# Altium footprint library BBC_Connectors.PcbLib: 141 footprints (part 5 of 9)
Each footprint in its own frame and in the unit in brackets; x right, y up, seen from the top. Pads: shape width x height; smd on the part's side, far side on the other; paste and mask are expansions set on the pad; w line width, h text height; cw(c..) or ccw(c..) is an arc to the next point about the centre after c.
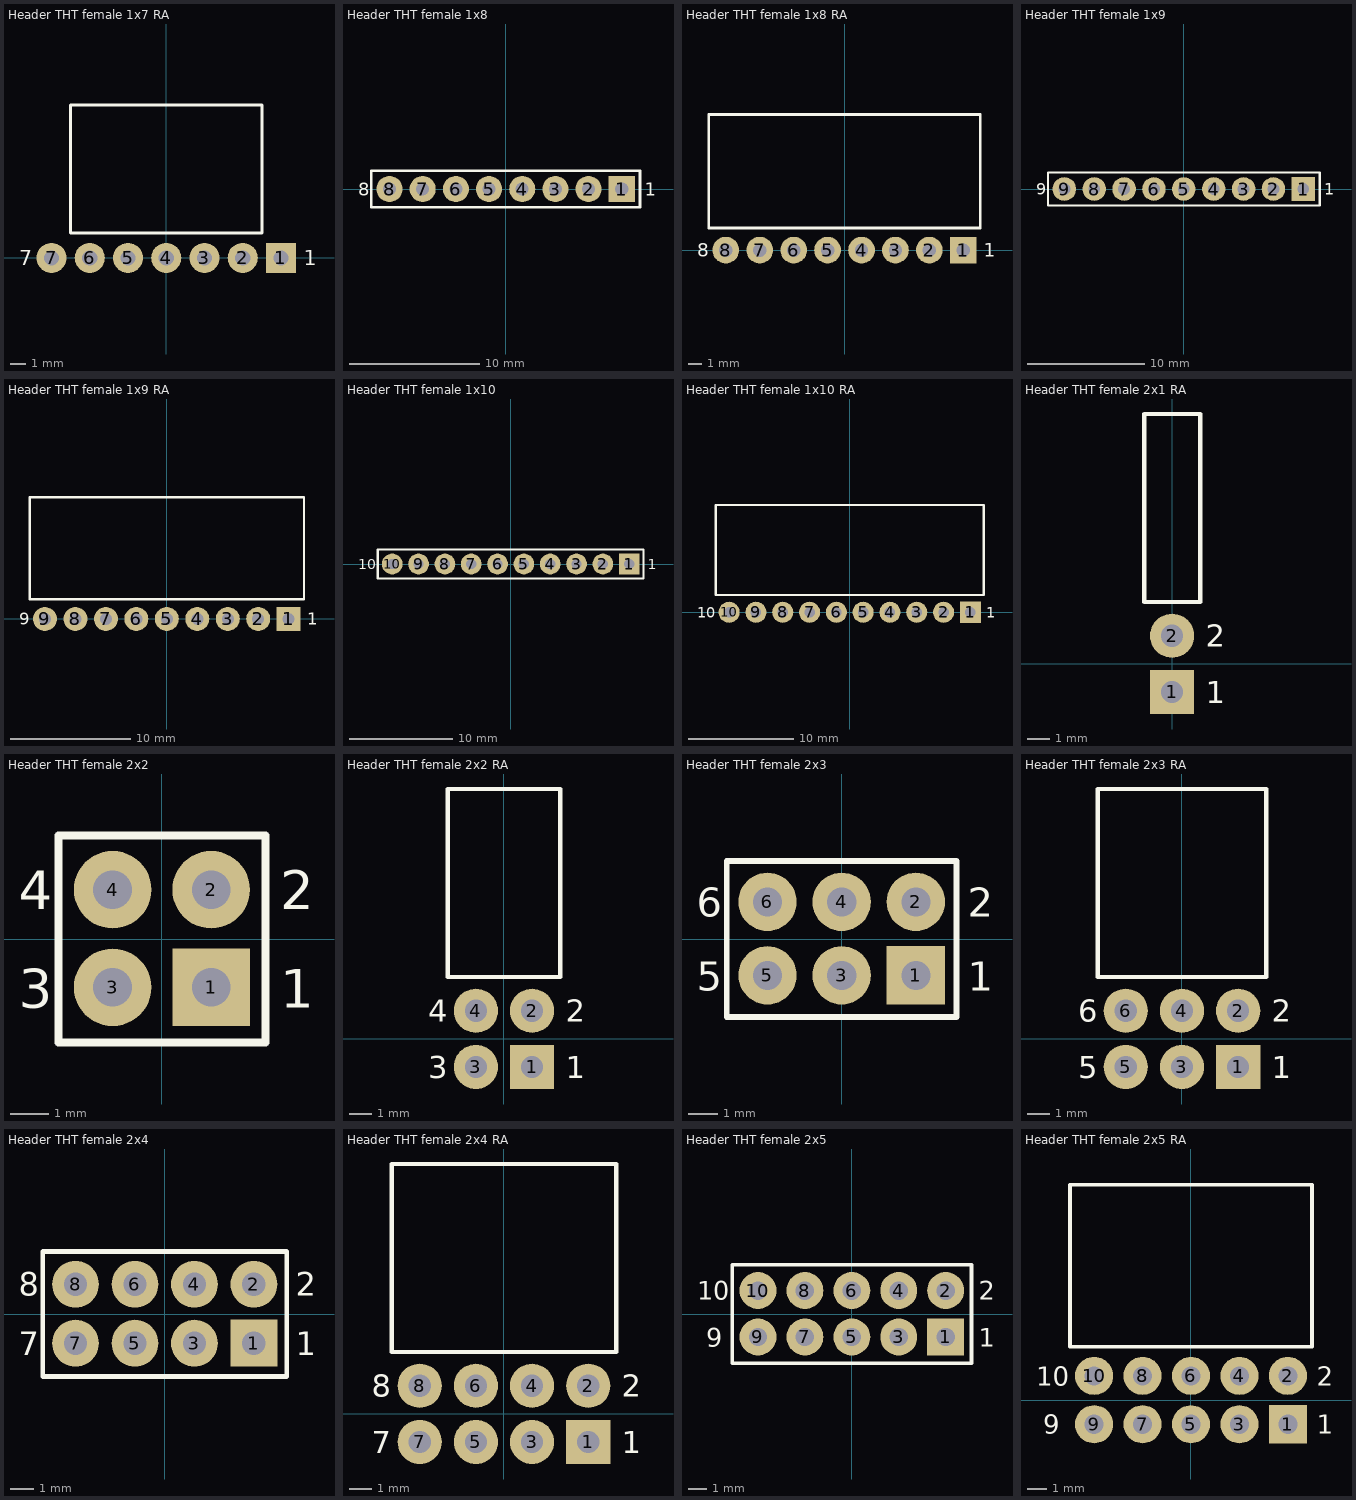
[diagram p4: the footprints below, top view; thin cyan lines are the x and y axes]

## Header THT female 1x7 RA [mm] "right angled header for tht mounting / pitch = 2.54mm"
height 3
pads (7):
  rect 2x2 hole 1: 1(7.62,0)
  round 2 hole 1: 2(5.08,0) 3(2.54,0) 4(0,0) 5(-2.54,0) 6(-5.08,0) 7(-7.62,0)
Top Overlay:
  lines w0.2: -6.35,1.651 6.35,1.651 6.35,10.151 -6.35,10.151 -6.35,1.651
  text "1" at 9.144,-0.5 h1
  text "7" at -9.779,-0.5 h1
3D body "Header THT female 1x7 RA.step": height 2.54, standoff -3.06, extent -8.89,-0.199 8.89,10.151
3D body: height 2.51, standoff -3, extent 2.54,3.81 2.54,3.81

## Header THT female 1x8 [mm] "header for tht mounting / pitch = 2.54mm"
height 11
pads (8):
  rect 2x2 hole 1: 1(8.89,0)
  round 2 hole 1: 2(6.35,0) 3(3.81,0) 4(1.27,0) 5(-1.27,0) 6(-3.81,0) 7(-6.35,0) 8(-8.89,0)
Top Overlay:
  lines w0.2: -10.287,-1.397 -10.287,1.397 10.287,1.397 10.287,-1.397 -10.287,-1.397
  text "8" at -11.303,-0.5 h1
  text "1" at 10.668,-0.5 h1
3D body: height 2.51, standoff -3, extent 2.54,3.81 2.54,3.81
3D body "Header THT female 1x8.step": height 8.5, standoff -3.2, extent -10.16,-1.27 10.16,1.27

## Header THT female 1x8 RA [mm] "right angled header for tht mounting / pitch = 2.54mm"
height 3
pads (8):
  rect 2x2 hole 1: 1(8.89,0)
  round 2 hole 1: 2(6.35,0) 3(3.81,0) 4(1.27,0) 5(-1.27,0) 6(-3.81,0) 7(-6.35,0) 8(-8.89,0)
Top Overlay:
  lines w0.2: -10.16,1.651 -10.16,10.151 10.16,10.151 10.16,1.651 -10.16,1.651
  text "8" at -11.049,-0.5 h1
  text "1" at 10.414,-0.5 h1
3D body "Header THT female 1x8 RA.step": height 2.54, standoff -3.06, extent -10.16,-0.199 10.16,10.151
3D body: height 2.51, standoff -3, extent 2.54,3.81 2.54,3.81

## Header THT female 1x9 [mm] "header for tht mounting / pitch = 2.54mm"
height 11
pads (9):
  rect 2x2 hole 1: 1(10.16,0)
  round 2 hole 1: 2(7.62,0) 3(5.08,0) 4(2.54,0) 5(0,0) 6(-2.54,0) 7(-5.08,0) 8(-7.62,0) 9(-10.16,0)
Top Overlay:
  lines w0.2: -11.557,-1.397 -11.557,1.397 11.557,1.397 11.557,-1.397 -11.557,-1.397
  text "9" at -12.573,-0.5 h1
  text "1" at 11.938,-0.5 h1
3D body: height 2.51, standoff -3, extent 2.54,3.81 2.54,3.81
3D body "Header THT female 1x9.step": height 8.5, standoff -3.2, extent -11.43,-1.27 11.43,1.27

## Header THT female 1x9 RA [mm] "right angled header for tht mounting / pitch = 2.54mm"
height 3
pads (9):
  rect 2x2 hole 1: 1(10.16,0)
  round 2 hole 1: 2(7.62,0) 3(5.08,0) 4(2.54,0) 5(0,0) 6(-2.54,0) 7(-5.08,0) 8(-7.62,0) 9(-10.16,0)
Top Overlay:
  lines w0.2: -11.43,1.651 -11.43,10.151 11.43,10.151 11.43,1.651 -11.43,1.651
  text "9" at -12.319,-0.5 h1
  text "1" at 11.684,-0.5 h1
3D body: height 2.51, standoff -3, extent 2.54,3.81 2.54,3.81
3D body "Header THT female 1x9 RA.step": height 2.54, standoff -3.06, extent -11.43,-0.199 11.43,10.151

## Header THT female 1x10 [mm] "header for tht mounting / pitch = 2.54mm"
height 11
pads (10):
  rect 2x2 hole 1: 1(11.43,0)
  round 2 hole 1: 2(8.89,0) 3(6.35,0) 4(3.81,0) 5(1.27,0) 6(-1.27,0) 7(-3.81,0) 8(-6.35,0) 9(-8.89,0) 10(-11.43,0)
Top Overlay:
  lines w0.2: -12.827,-1.397 12.827,-1.397 12.827,1.397 -12.827,1.397 -12.827,-1.397
  text "10" at -14.732,-0.5 h1
  text "1" at 13.208,-0.5 h1
3D body: height 2.51, standoff -3, extent 2.54,3.81 2.54,3.81
3D body "Header THT female 1x10.step": height 8.5, standoff -3.2, extent -12.7,-1.27 12.7,1.27

## Header THT female 1x10 RA [mm] "right angled header for tht mounting / pitch = 2.54mm"
height 3
pads (10):
  rect 2x2 hole 1: 1(11.43,0)
  round 2 hole 1: 2(8.89,0) 3(6.35,0) 4(3.81,0) 5(1.27,0) 6(-1.27,0) 7(-3.81,0) 8(-6.35,0) 9(-8.89,0) 10(-11.43,0)
Top Overlay:
  lines w0.2: -12.7,1.651 -12.7,10.151 12.7,10.151 12.7,1.651 -12.7,1.651
  text "10" at -14.478,-0.5 h1
  text "1" at 12.954,-0.5 h1
3D body "Header THT female 1x10 RA.step": height 2.54, standoff -3.06, extent -12.7,-0.199 12.7,10.151
3D body: height 2.51, standoff -3, extent 2.54,3.81 2.54,3.81

## Header THT female 2x1 RA [mm] "right angled header for tht mounting / pitch = 2.54mm"
height 6
pads (2):
  rect 2x2 hole 1: 1(0,-1.27)
  round 2 hole 1: 2(0,1.27)
Top Overlay:
  lines w0.2: -1.27,2.794 -1.27,11.294 1.27,11.294 1.27,2.794 -1.27,2.794
  text "2" at 1.524,0.762 h1
  text "1" at 1.524,-1.778 h1
3D body: height 2.51, standoff -3, extent 2.54,3.81 2.54,3.81
3D body "Header THT female 2x1 RA.step": height 4.94, standoff -3.2, extent -1.27,-1.596 1.27,11.294

## Header THT female 2x2 [mm] "header for tht mounting / pitch = 2.54mm"
height 11
pads (4):
  rect 2x2 hole 1: 1(1.27,-1.245)
  round 2 hole 1: 2(1.27,1.27) 3(-1.27,-1.245) 4(-1.27,1.27)
Top Overlay:
  lines w0.2: -2.667,-2.667 -2.667,2.667 2.667,2.667 2.667,-2.667 -2.667,-2.667
  text "4" at -3.683,0.77 h1
  text "2" at 3.048,0.77 h1
  text "1" at 3.048,-1.77 h1
  text "3" at -3.683,-1.77 h1
3D body: height 2.51, standoff -3, extent 2.54,3.81 2.54,3.81
3D body "Header THT female 2x2.step": height 8.5, standoff -3.2, extent -2.54,-2.54 2.54,2.54

## Header THT female 2x2 RA [mm] "right angled header for tht mounting / pitch = 2.54mm"
height 6
pads (4):
  rect 2x2 hole 1: 1(1.27,-1.27)
  round 2 hole 1: 2(1.27,1.27) 3(-1.27,-1.27) 4(-1.27,1.27)
Top Overlay:
  lines w0.2: -2.54,2.794 2.54,2.794 2.54,11.294 -2.54,11.294 -2.54,2.794
  text "1" at 2.794,-1.778 h1
  text "2" at 2.794,0.762 h1
  text "3" at -3.429,-1.778 h1
  text "4" at -3.429,0.762 h1
3D body: height 2.51, standoff -3, extent 2.54,3.81 2.54,3.81
3D body "Header THT female 2x2 RA.step": height 4.94, standoff -3.2, extent -2.54,-1.596 2.54,11.294

## Header THT female 2x3 [mm] "header for tht mounting / pitch = 2.54mm"
height 11
pads (6):
  rect 2x2 hole 1: 1(2.54,-1.245)
  round 2 hole 1: 2(2.54,1.27) 3(0,-1.245) 4(0,1.27) 5(-2.54,-1.245) 6(-2.54,1.27)
Top Overlay:
  lines w0.2: -3.937,-2.667 3.937,-2.667 3.937,2.667 -3.937,2.667 -3.937,-2.667
  text "5" at -4.953,-1.77 h1
  text "1" at 4.318,-1.77 h1
  text "2" at 4.318,0.77 h1
  text "6" at -4.953,0.77 h1
3D body "Header THT female 2x3.step": height 8.5, standoff -3.2, extent -3.81,-2.54 3.81,2.54
3D body: height 2.51, standoff -3, extent 2.54,3.81 2.54,3.81

## Header THT female 2x3 RA [mm] "right angled header for tht mounting / pitch = 2.54mm"
height 6
pads (6):
  rect 2x2 hole 1: 1(2.54,-1.27)
  round 2 hole 1: 2(2.54,1.27) 3(0,-1.27) 4(0,1.27) 5(-2.54,-1.27) 6(-2.54,1.27)
Top Overlay:
  lines w0.2: -3.81,2.794 3.81,2.794 3.81,11.294 -3.81,11.294 -3.81,2.794
  text "5" at -4.699,-1.778 h1
  text "6" at -4.699,0.762 h1
  text "1" at 4.064,-1.778 h1
  text "2" at 4.064,0.762 h1
3D body "Header THT female 2x3 RA.step": height 4.94, standoff -3.2, extent -3.81,-1.596 3.81,11.294
3D body: height 2.51, standoff -3, extent 2.54,3.81 2.54,3.81

## Header THT female 2x4 [mm] "header for tht mounting / pitch = 2.54mm"
height 11
pads (8):
  rect 2x2 hole 1: 1(3.81,-1.245)
  round 2 hole 1: 2(3.81,1.27) 3(1.27,-1.245) 4(1.27,1.27) 5(-1.27,-1.245) 6(-1.27,1.27) 7(-3.81,-1.245) 8(-3.81,1.27)
Top Overlay:
  lines w0.2: -5.207,-2.667 5.207,-2.667 5.207,2.667 -5.207,2.667 -5.207,-2.667
  text "8" at -6.223,0.77 h1
  text "2" at 5.588,0.77 h1
  text "1" at 5.588,-1.77 h1
  text "7" at -6.223,-1.77 h1
3D body: height 2.51, standoff -3, extent 2.54,3.81 2.54,3.81
3D body "Header THT female 2x4.step": height 8.5, standoff -3.2, extent -5.08,-2.54 5.08,2.54

## Header THT female 2x4 RA [mm] "right angled header for tht mounting / pitch = 2.54mm"
height 6
pads (8):
  rect 2x2 hole 1: 1(3.81,-1.27)
  round 2 hole 1: 2(3.81,1.27) 3(1.27,-1.27) 4(1.27,1.27) 5(-1.27,-1.27) 6(-1.27,1.27) 7(-3.81,-1.27) 8(-3.81,1.27)
Top Overlay:
  lines w0.2: -5.08,2.794 -5.08,11.294 5.08,11.294 5.08,2.794 -5.08,2.794
  text "8" at -5.969,0.762 h1
  text "7" at -5.969,-1.778 h1
  text "2" at 5.334,0.762 h1
  text "1" at 5.334,-1.778 h1
3D body "Header THT female 2x4 RA.step": height 4.94, standoff -3.2, extent -5.08,-1.596 5.08,11.294
3D body: height 2.51, standoff -3, extent 2.54,3.81 2.54,3.81

## Header THT female 2x5 [mm] "header for tht mounting / pitch = 2.54mm"
height 11
pads (10):
  rect 2x2 hole 1: 1(5.08,-1.245)
  round 2 hole 1: 2(5.08,1.27) 3(2.54,-1.245) 4(2.54,1.27) 5(0,-1.245) 6(0,1.27) 7(-2.54,-1.245) 8(-2.54,1.27) 9(-5.08,-1.245) 10(-5.08,1.27)
Top Overlay:
  lines w0.2: -6.477,-2.667 6.477,-2.667 6.477,2.667 -6.477,2.667 -6.477,-2.667
  text "9" at -7.874,-1.77 h1
  text "1" at 6.858,-1.77 h1
  text "2" at 6.858,0.77 h1
  text "10" at -8.382,0.77 h1
3D body: height 2.51, standoff -3, extent 2.54,3.81 2.54,3.81
3D body "Header THT female 2x5.step": height 8.5, standoff -3.2, extent -6.35,-2.54 6.35,2.54

## Header THT female 2x5 RA [mm] "right angled header for tht mounting / pitch = 2.54mm"
height 6
pads (10):
  rect 2x2 hole 1: 1(5.08,-1.27)
  round 2 hole 1: 2(5.08,1.27) 3(2.54,-1.27) 4(2.54,1.27) 5(0,-1.27) 6(0,1.27) 7(-2.54,-1.27) 8(-2.54,1.27) 9(-5.08,-1.27) 10(-5.08,1.27)
Top Overlay:
  lines w0.2: -6.35,2.794 6.35,2.794 6.35,11.294 -6.35,11.294 -6.35,2.794
  text "9" at -7.747,-1.778 h1
  text "10" at -8.128,0.762 h1
  text "1" at 6.604,-1.778 h1
  text "2" at 6.604,0.762 h1
3D body "Header THT female 2x5 RA.step": height 4.94, standoff -3.2, extent -6.35,-1.596 6.35,11.294
3D body: height 2.51, standoff -3, extent 2.54,3.81 2.54,3.81